# Altium footprint library PCBKU.PcbLib: 190 footprints (part 9 of 12)
Each footprint in its own frame and in the unit in brackets; x right, y up, seen from the top. Pads: shape width x height; smd on the part's side, far side on the other; paste and mask are expansions set on the pad; w line width, h text height; cw(c..) or ccw(c..) is an arc to the next point about the centre after c.
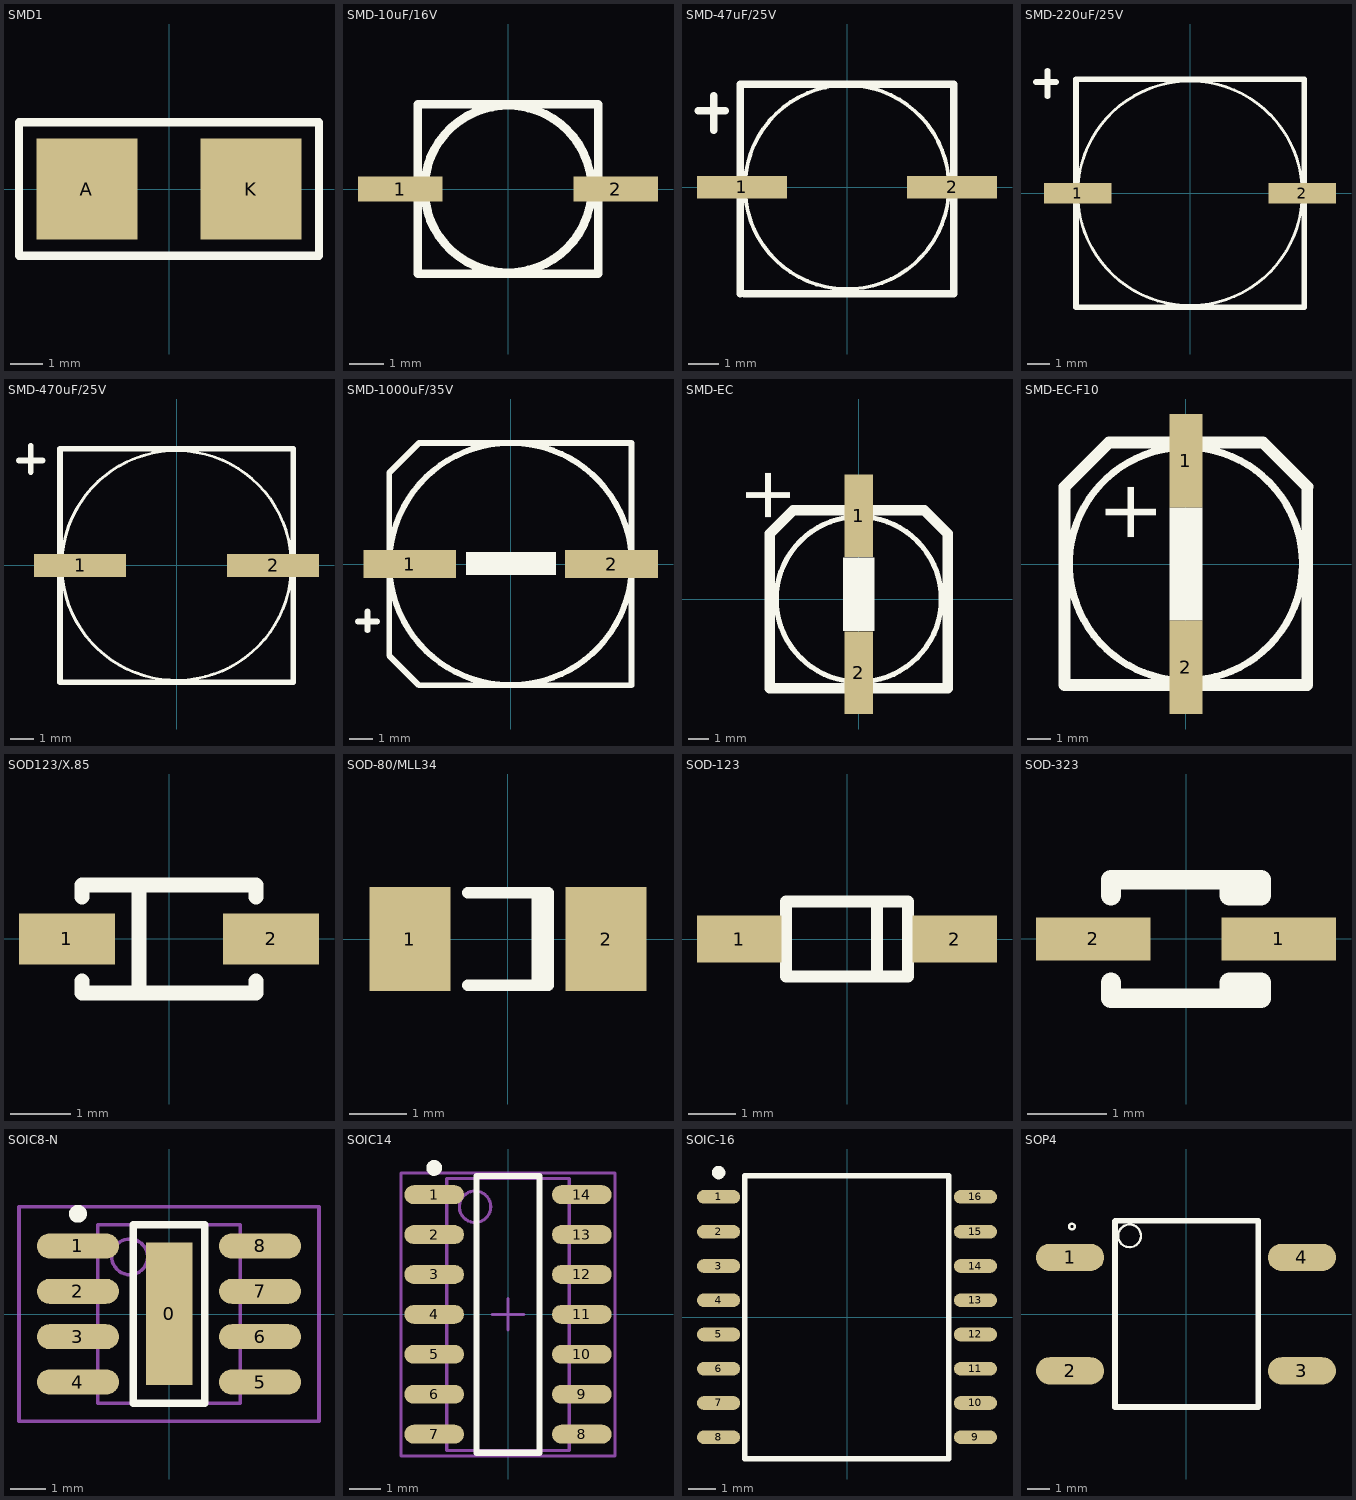
[diagram p8: the footprints below, top view; thin cyan lines are the x and y axes]

## SMD1 [mm]
pads (2):
  rect 3.067x3.067 smd: A(-2.5,0) K(2.5,0)
Top Overlay:
  lines w0.254: -4.572,-2.032 -4.572,1.524 -4.572,2.032 4.572,2.032 4.572,-2.032 -4.572,-2.032

## SMD-10uF/16V [mm]
pads (2):
  rect 2.5x0.75 smd: 1(-3.175,0) 2(3.175,0)
Top Overlay:
  circle w0.254: c0,0 r2.466
  lines w0.254: -2.667,-2.5 2.667,-2.5 2.667,2.5 -2.667,2.5 -2.667,-2.5

## SMD-47uF/25V [mm]
pads (2):
  rect 3x0.75 smd: 1(-3.5,0) 2(3.5,0)
Top Overlay:
  circle w0.127: c0,0 r3.4
  lines w0.254: -4.953,2.54 -4.064,2.54 ; -4.445,1.905 -4.445,3.048 ; -3.556,-3.556 -3.556,3.429 0,3.429 3.556,3.429 3.556,-3.556 -3.429,-3.556

## SMD-220uF/25V [mm]
pads (2):
  rect 3x0.9 smd: 1(-5,0) 2(5,0)
Top Overlay:
  circle w0.127: c0,0 r5
  lines w0.254: -6.858,4.953 -5.969,4.953 ; -6.35,4.318 -6.35,5.461 ; -5.08,-5.08 -5.08,5.08 5.08,5.08 5.08,-5.08 -5.08,-5.08

## SMD-470uF/25V [mm]
pads (2):
  rect 4x1 smd: 1(-4.2,0) 2(4.2,0)
Top Overlay:
  circle w0.127: c0,0 r5
  lines w0.254: -6.858,4.572 -5.842,4.572 ; -6.35,4.064 -6.35,5.207 ; -5.08,-5.08 5.08,-5.08 5.08,5.08 -4.445,5.08 -5.08,5.08 -5.08,-5.08

## SMD-1000uF/35V [mm]
pads (2):
  rect 4x1.2 smd: 1(-4.34,0) 2(4.34,0)
Top Overlay:
  circle w0.254: c0,0 r5.214
  rectangle: -1.93,-0.483 1.956,0.508
  lines w0.254: -6.566,-2.471 -5.753,-2.471 ; -6.159,-2.852 -6.159,-2.039 ; -5.22,-3.944 -5.22,3.93 -3.95,5.2 5.194,5.2 5.194,-5.214 -3.95,-5.214 -5.22,-3.944

## SMD-EC [mm]
pads (2):
  rect 1.4x4 smd: 1(0,4.049) 2(0,-3.556)
Top Overlay:
  circle w0.254: c0,0 r4
  region: -0.773,2.032 -0.773,-1.524 0.762,-1.524 0.762,2.032
  lines w0.508: -4.318,-4.318 4.318,-4.318 4.318,3.175 3.175,4.318 -3.175,4.318 -4.318,3.175 -4.318,-4.318
  text "+" at -5.461,6.477 h2.5

## SMD-EC-F10 [mm]
pads (2):
  rect 1.4x4 smd: 1(0,4.43) 2(0,-4.43)
Top Overlay:
  circle w0.305: c0,0.007 r5
  region: -0.701,2.424 -0.701,-2.419 0.707,-2.419 0.707,2.424
  lines w0.508: 5.2,3.307 5.2,-5.19 -5.201,-5.19 -5.201,3.31 -3.304,5.207 3.306,5.207 5.203,3.31
  text "+" at -3.44,3.649 h2.5

## SOD123/X.85 [mm]
height 1.1
pads (2):
  rect 1.6x0.85 smd: 1(-1.7,0) 2(1.7,0)
Top Overlay:
  lines w0.25: -1.45,-0.7 -1.45,-0.9 1.45,-0.9 1.45,-0.7 ; -1.45,0.7 -1.45,0.9 1.45,0.9 1.45,0.7 ; -0.5,-0.9 -0.5,0.9

## SOD-80/MLL34 [mm]
pads (2):
  rect 1.4x1.8 smd: 1(-1.7,0) 2(1.7,0)
Top Overlay:
  lines w0.2: -0.7,-0.8 0.7,-0.8 0.7,0.8 -0.7,0.8 ; 0.51,-0.8 0.51,0.8

## SOD-123 [mm]
height 1.1
pads (2):
  rect 1.8x1 smd: 1(-2.286,0) 2(2.286,0)
Top Overlay:
  lines w0.254: 0.635,-0.8 0.635,0.8 ; -1.3,-0.8 -1.3,0.8 1.3,0.8 1.3,-0.8 -1.3,-0.8
3D body: height 1.27, standoff 0, extent -1.698,-0.813 2.002,0.787

## SOD-323 [mm]
height 1.1
pads (2):
  rect 1.45x0.55 smd: 1(1.175,0) 2(-1.175,0)
Top Overlay:
  lines w0.25: -0.95,-0.55 -0.95,-0.75 0.95,-0.75 0.95,-0.55 0.55,-0.55 0.55,-0.75 ; -0.95,0.55 -0.95,0.75 0.95,0.75 0.95,0.55 0.55,0.55 0.55,0.75

## SOIC8-N [mm]
pads (9):
  rect 1.3x4 smd: 0(0.011,0.007)
  oval 2.3x0.7 smd: 1(-2.55,1.905) 2(-2.55,0.635) 3(-2.55,-0.635) 4(-2.55,-1.905) 5(2.55,-1.905) 6(2.55,-0.635) 7(2.55,0.635) 8(2.55,1.905)
Top Overlay:
  circle w0.25: c-2.55,2.805 r0.125
  lines w0.2: -1,-2.5 -1,2.5 1,2.5 1,-2.5 -1,-2.5
Mechanical 13:
  circle w0.1: c-1.1,1.6 r0.5
  lines w0.1: -2,-2.5 -2,2.5 2,2.5 2,-2.5 -2,-2.5
Mechanical 15:
  lines w0.1: -0.5,0 0.5,0 ; 0,-0.5 0,0.5 ; -4.2,-3 -4.2,3 4.2,3 4.2,-3 -4.2,-3
3D body: height 1.55, standoff 0, extent -2,-2.5 2,2.5

## SOIC14 [mm] "14-Pin Small Outline Integrated Circuit 1.27 mm Pitch, IPC High Density"
height 1.91
pads (14):
  oval 1.9x0.6 smd: 1(-2.35,3.81) 2(-2.35,2.54) 3(-2.35,1.27) 4(-2.35,0) 5(-2.35,-1.27) 6(-2.35,-2.54) 7(-2.35,-3.81) 8(2.35,-3.81) 9(2.35,-2.54) 10(2.35,-1.27) 11(2.35,0) 12(2.35,1.27) 13(2.35,2.54) 14(2.35,3.81)
Top Overlay:
  circle w0.25: c-2.35,4.66 r0.125
  lines w0.2: -1,-4.4 -1,4.4 1,4.4 1,-4.4 -1,-4.4
Mechanical 13:
  circle w0.1: c-1.05,3.425 r0.5
  lines w0.1: -1.95,-4.325 -1.95,4.325 1.95,4.325 1.95,-4.325 -1.95,-4.325
Mechanical 15:
  lines w0.1: -0.5,0 0.5,0 ; 0,-0.5 0,0.5 ; -3.4,-4.5 -3.4,4.5 3.4,4.5 3.4,-4.5 -3.4,-4.5
3D body: height 1.91, standoff 0, extent -1.95,-4.325 1.95,4.325

## SOIC-16 [mm]
pads (16):
  oval 1.6x0.51 smd: 1(-4.763,4.458) 2(-4.763,3.162) 3(-4.763,1.892) 4(-4.763,0.622) 5(-4.763,-0.648) 6(-4.763,-1.918) 7(-4.763,-3.188) 8(-4.763,-4.458) 9(4.763,-4.458) 10(4.763,-3.188) 11(4.763,-1.918) 12(4.763,-0.648) 13(4.763,0.622) 14(4.763,1.892) 15(4.763,3.162) 16(4.763,4.458)
Top Overlay:
  circle w0.25: c-4.763,5.358 r0.125
  lines w0.203: -3.797,-5.256 -3.797,5.234 3.772,5.234 3.772,-5.256 -3.797,-5.256

## SOP4 [mm]
height 1.1
pads (4):
  oval 3x1.2 smd: 1(-5.112,2.5) 2(-5.112,-2.5) 3(5.112,-2.5) 4(5.112,2.5)
Top Overlay:
  circle w0.1: c-5.027,3.861 r0.125
  circle w0.1: c-2.488,3.449 r0.5
  lines w0.25: -3.131,-4.1 -3.131,4.1 ; -3.118,-4.095 3.182,-4.095 ; -3.118,4.109 3.182,4.109 ; 3.181,-4.1 3.181,4.1